# Altium footprint library Cty1.PcbLib: 1378 footprints (part 85 of 87)
Each footprint in its own frame and in the unit in brackets; x right, y up, seen from the top. Pads: shape width x height; smd on the part's side, far side on the other; paste and mask are expansions set on the pad; w line width, h text height; cw(c..) or ccw(c..) is an arc to the next point about the centre after c.
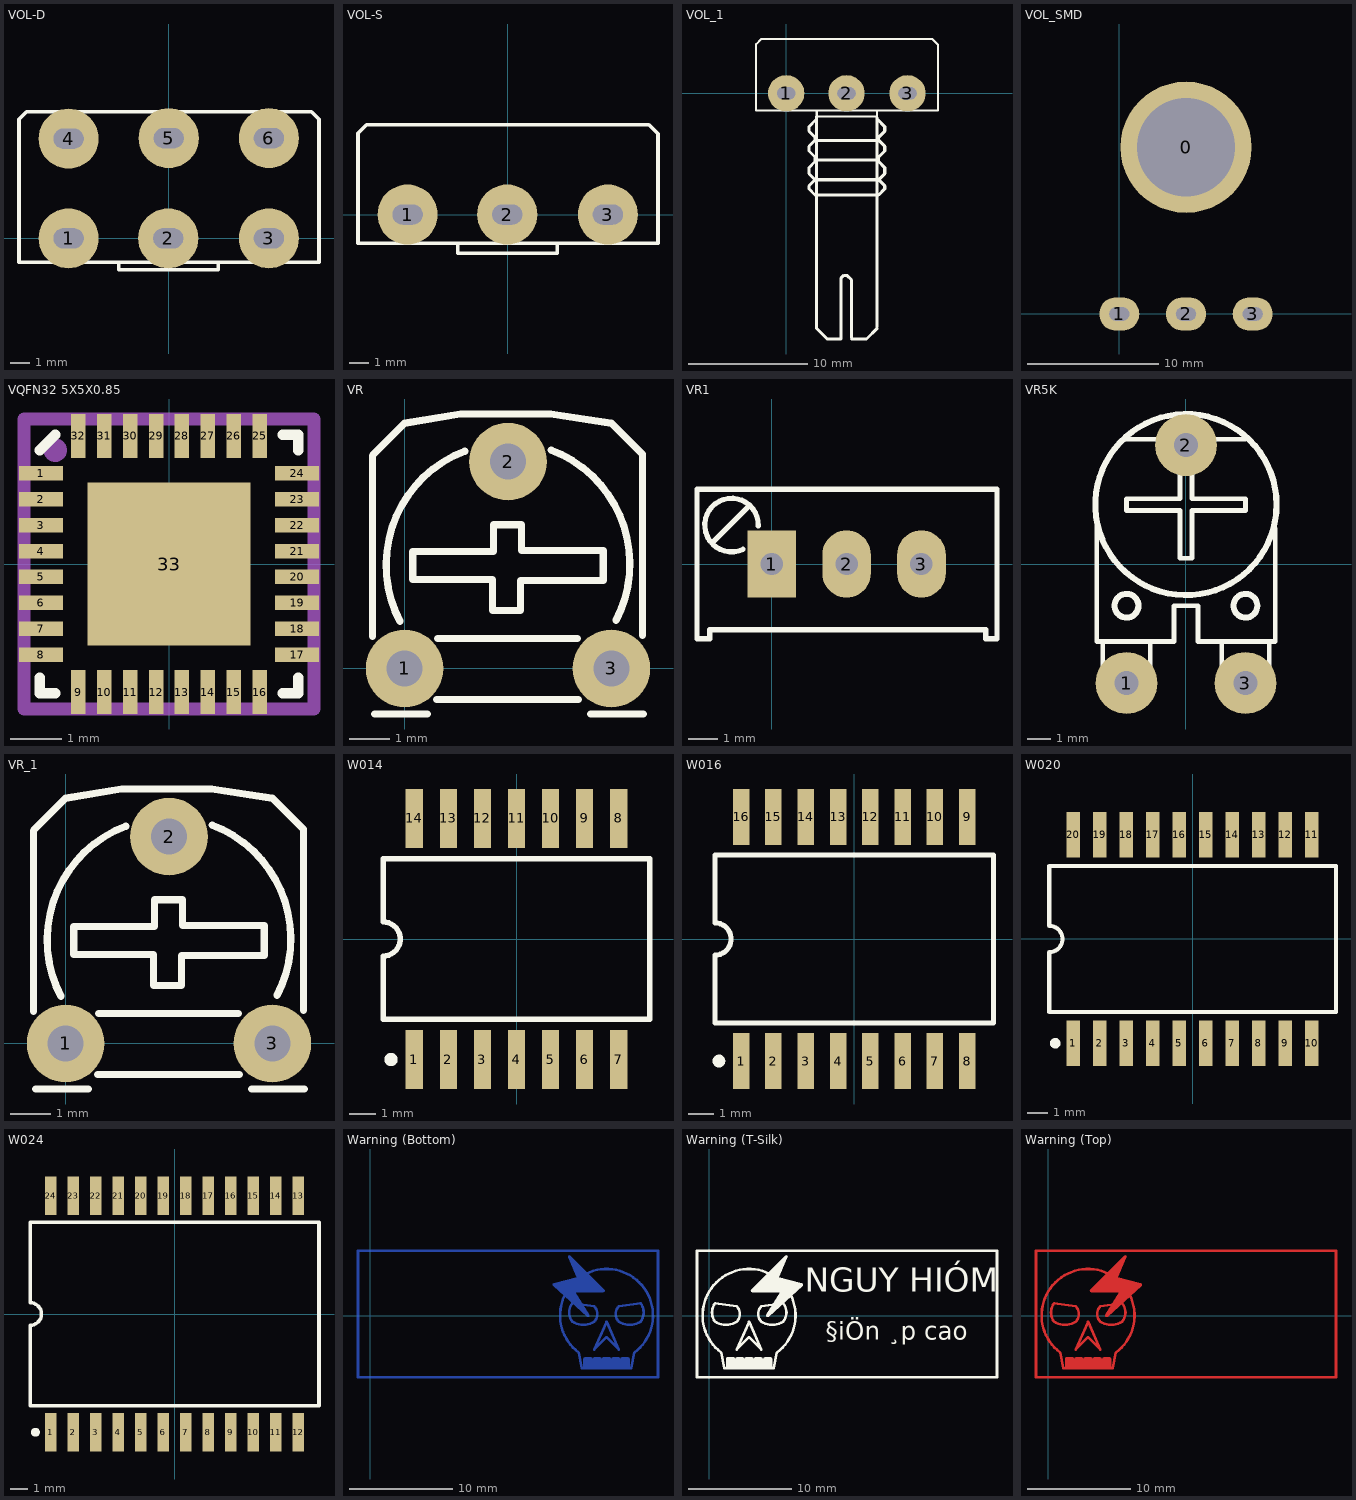
[diagram p84: the footprints below, top view; thin cyan lines are the x and y axes]

## VOL-D [mil] "Volume control Dual"
height 400
pads (6):
  round 120 hole 40 slot 60 at 0 deg: 1(-200,0) 2(-1,0) 3(200,0) 4(-200,199) 5(0,200) 6(200,200)
Top Overlay:
  lines w7: -100,-48 -100,-63 99,-63 99,-48 ; -299,-48 300,-48 300,238 285,253 -284,253 -299,238 -299,-48
3D body "SW3dPS-ALPHA-potentiometer stereo PCB mount.STEP": height 834.65, standoff -129.92, extent -338.65,-1309.27 330.65,299

## VOL-S [mil] "Volume control single"
height 400
pads (3):
  round 120 hole 40 slot 60 at 0 deg: 1(-200,0) 2(-1,0) 3(200,0)
Top Overlay:
  lines w7: -100,-57 -100,-77 99,-77 99,-57 ; -299,-57 -299,162 -282,179 282,179 300,161 300,-57 -299,-57

## VOL_1 [mil]
pads (3):
  round 120 hole 40 slot 60 at 0 deg: 1(0,0) 2(199,0) 3(400,0)
Top Overlay:
  lines w7: 100,-57 100,-77 299,-77 299,-57 ; 101,-77 101,-57 ; -99,-57 500,-57 500,161 482,179 -82,179 -99,162 -99,-57
  lines w10: 95,-335 75,-315 75,-305 95,-285 75,-265 75,-245 95,-225 95,-210 75,-190 75,-175 95,-155 95,-145 75,-125 75,-110 100,-85 ; 95,-220 300,-220 ; 100,-770 100,-77 ; 100,-760 100,-775 135,-810 180,-810 180,-610 190,-600 200,-600 215,-615 215,-805 ; 100,-335 305,-335 325,-315 325,-305 305,-285 ; 100,-285 305,-285 ; 105,-155 300,-155 ; 215,-810 265,-810 300,-775 ; 300,-770 300,-80 ; 300,-85 325,-110 325,-125 305,-145 305,-155 325,-175 325,-190 305,-210 305,-225 325,-245 325,-265 305,-285
3D body "SW3dPS-Pot.STEP": height 839.35, standoff -130, extent -110,-818.11 510,188.11

## VOL_SMD [mil]
pads (4):
  round 393.7 hole 295.28: 0(200,500)
  oval 120x100 hole 40 slot 60 at 0 deg: 1(0,0) 2(200,0) 3(400,0)
Bottom Overlay:
  circle w12: c400,150 r50
  circle w12: c200,150 r50
  circle w12: c0,150 r50
  circle w12: c200,500 r215.01
  lines w12: -57.25,301.71 cw(c200,500) 455.57,299.55 ; -55,299 127,299 ; -49,700 119,700 ; 281,298 455,298 ; 286,698 454,698 ; 455,295 500,250 500,-75 -100,-75 -100,255 ; -100,255 -55,300 -100,255
3D body "SW3dPS-omeg pot.STEP": height 866.14, standoff -407.48, extent -203.15,-247.08 600,947.08

## VQFN32 5X5X0.85 [mm] "Creator MM"
pads (33):
  rect 0.85x0.28 smd mask+0.025: 1(-2.475,1.75) 2(-2.475,1.25) 3(-2.475,0.75) 4(-2.475,0.25) 5(-2.475,-0.25) 6(-2.475,-0.75) 7(-2.475,-1.25) 8(-2.475,-1.75) 17(2.475,-1.75) 18(2.475,-1.25) 19(2.475,-0.75) 20(2.475,-0.25) 21(2.475,0.25) 22(2.475,0.75) 23(2.475,1.25) 24(2.475,1.75)
  rect 0.28x0.85 smd mask+0.025: 9(-1.75,-2.475) 10(-1.25,-2.475) 11(-0.75,-2.475) 12(-0.25,-2.475) 13(0.25,-2.475) 14(0.75,-2.475) 15(1.25,-2.475) 16(1.75,-2.475) 25(1.75,2.475) 26(1.25,2.475) 27(0.75,2.475) 28(0.25,2.475) 29(-0.25,2.475) 30(-0.75,2.475) 31(-1.25,2.475) 32(-1.75,2.475)
  rect 3.15x3.15 smd paste-10 mask+0.025: 33(0,0)
Top Overlay:
  lines w0.2: -2.5,-2.2 -2.5,-2.5 -2.2,-2.5 ; -2.5,2.2 -2.2,2.5 ; 2.2,-2.5 2.5,-2.5 2.5,-2.2 ; 2.2,2.5 2.5,2.5 2.5,2.2
Top Paste:
  rectangle: -1.5,0.1 -0.1,1.5
  region: 0.1,1.5 0.1,0.1 1.5,0.1 1.5,1.5
  region: -0.1,-1.5 -0.1,-0.1 -1.5,-0.1 -1.5,-1.5
  region: 1.5,-0.1 0.1,-0.1 0.1,-1.5 1.5,-1.5
Mechanical 16:
  circle w0.254: c-2.2,2.2 r0.1
  lines w0.254: -2.8,-2.8 -2.8,2.8 2.8,2.8 2.8,-2.8 -2.8,-2.8
Mechanical 29:
  text ".Designator" at -0.6,1 h1.2
3D body: height 0.9, standoff 0, extent -2.5,-2.5 2.5,2.5

## VR [mil] "Resistor Variable"
height 200
pads (3):
  round 75 hole 35: 1(0,0) 2(100,200) 3(200,0)
Top Overlay:
  lines w7: -31,31 -31,206 0,237 54,246 141.5,246 200,237 230,207 230,32 ; -29,-44 22,-44 ; -4.35,45.34 cw(c100,100) 58.1,210.1 ; 8,113 8,86 85,86 85,56 112,56 112,85 192,85 192,114 113,114 113,139 86,139 86,113 9,113 ; 31,-30 168,-30 ; 32,29 167,29 ; 141.9,211.1 cw(c100,101) 204.35,46.34 ; 180,-44 231,-44
3D body "SW3dPS-Trimpot Horizontal.STEP": height 165.35, standoff -220.47, extent -86.85,-30 306.85,371.57

## VR1 [mil] "Variable Resistor"
height 400
pads (3):
  rect 65x90 hole 30: 1(0,0)
  oval 65x90 hole 30: 2(100,0) 3(200,0)
Top Overlay:
  lines w7: -80,28 -30,78 ; -38.6,19.63 cw(c-53.79,52.05) -18.01,50.77 ; -100,-100 -83,-100 -83,-88 286,-88 286,-100 301,-100 301,100 -100,100 -100,-100
3D body "SW3dPS-Bourns_3299W.STEP": height 455, standoff -45, extent -87.5,-130 287.5,110

## VR5K [mm]
pads (3):
  round 2.6 hole 1 paste+5: 1(-2.5,-5) 2(0,5) 3(2.5,-5)
Top Overlay:
  circle w0.254: c0,2.5 r3.808
  circle w0.254: c2.5,-1.75 r0.5
  circle w0.254: c-2.5,-1.75 r0.5
  lines w0.2: -3.75,1.75 -3.75,-3.25 -0.5,-3.25 -0.5,-1.75 0.5,-1.75 0.5,-3.25 3.75,-3.25 3.75,1.5 ; -3.5,-4.25 -3.5,-3.25 ; -2.5,5.25 2.5,5.25 ; -1.5,-4.75 -1.5,-3.25 ; 1.5,-4.75 1.5,-3.25 ; 3.5,-4.75 3.5,-3.25 ; -2.5,2.25 -0.25,2.25 -0.25,0.25 0.25,0.25 0.25,2.25 2.5,2.25 2.5,2.75 0.25,2.75 0.25,4.75 -0.25,4.75 -0.25,2.75 -2.5,2.75 -2.5,2.25
3D body "VR-1-3D.STEP": height 7.62, standoff -2.54, extent -4.318,-5.045 4.318,5.75

## VR_1 [mil] "Resistor Variable"
height 200
pads (3):
  round 75 hole 35: 1(0,0) 2(100,200) 3(200,0)
Top Overlay:
  lines w7: -31,31 -31,206 0,237 54,246 141.5,246 200,237 230,207 230,32 ; -29,-44 22,-44 ; -4.35,45.34 cw(c100,100) 58.1,210.1 ; 8,113 8,86 85,86 85,56 112,56 112,85 192,85 192,114 113,114 113,139 86,139 86,113 9,113 ; 31,-30 168,-30 ; 32,29 167,29 ; 141.9,211.1 cw(c100,101) 204.35,46.34 ; 180,-44 231,-44
3D body "User Library-Trimmer varistor-1.STEP": height 300, standoff -119.49, extent -34.05,-86.98 234.06,237.89

## W014 [mm] "DFP; 14 Leads; Body 9.9 x 6.6 mm (LxW max); Pitch 1.27 mm"
height 2.03
pads (14):
  rect 0.65x2.2 smd: 1(-3.81,-4.5) 2(-2.54,-4.5) 3(-1.27,-4.5) 4(0,-4.5) 5(1.27,-4.5) 6(2.54,-4.5) 7(3.81,-4.5) 8(3.81,4.5) 9(2.54,4.5) 10(1.27,4.5) 11(0,4.5) 12(-1.27,4.5) 13(-2.54,4.5) 14(-3.81,4.5)
Top Overlay:
  circle w0.25: c-4.685,-4.5 r0.125
  lines w0.2: -4.975,-3 4.975,-3 4.975,3 -4.975,3 -4.975,0.635 cw(c-4.975,0) -4.975,-0.635 -4.975,-3

## W016 [mm] "DFP; 16 Leads; Body 10.9 x 7.2 mm (LxW max); Pitch 1.27 mm"
height 2.03
pads (16):
  rect 0.65x2.2 smd: 1(-4.445,-4.8) 2(-3.175,-4.8) 3(-1.905,-4.8) 4(-0.635,-4.8) 5(0.635,-4.8) 6(1.905,-4.8) 7(3.175,-4.8) 8(4.445,-4.8) 9(4.445,4.8) 10(3.175,4.8) 11(1.905,4.8) 12(0.635,4.8) 13(-0.635,4.8) 14(-1.905,4.8) 15(-3.175,4.8) 16(-4.445,4.8)
Top Overlay:
  circle w0.25: c-5.32,-4.8 r0.125
  lines w0.2: -5.475,-3.3 5.475,-3.3 5.475,3.3 -5.475,3.3 -5.475,0.635 cw(c-5.475,0) -5.475,-0.635 -5.475,-3.3

## W020 [mm] "DFP; 20 Leads; Body 13.7 x 7.6 mm (LxW max); Pitch 1.27 mm"
height 2.54
pads (20):
  rect 0.65x2.2 smd: 1(-5.715,-5) 2(-4.445,-5) 3(-3.175,-5) 4(-1.905,-5) 5(-0.635,-5) 6(0.635,-5) 7(1.905,-5) 8(3.175,-5) 9(4.445,-5) 10(5.715,-5) 11(5.715,5) 12(4.445,5) 13(3.175,5) 14(1.905,5) 15(0.635,5) 16(-0.635,5) 17(-1.905,5) 18(-3.175,5) 19(-4.445,5) 20(-5.715,5)
Top Overlay:
  circle w0.25: c-6.59,-5 r0.125
  lines w0.2: -6.875,-3.5 6.875,-3.5 6.875,3.5 -6.875,3.5 -6.875,0.635 cw(c-6.875,0) -6.875,-0.635 -6.875,-3.5

## W024 [mm] "DFP; 24 Leads; Body 16.3 x 9.5 mm (LxW max); Pitch 1.27 mm"
height 2.29
pads (24):
  rect 0.65x2.2 smd: 1(-6.985,-6.675) 2(-5.715,-6.675) 3(-4.445,-6.675) 4(-3.175,-6.675) 5(-1.905,-6.675) 6(-0.635,-6.675) 7(0.635,-6.675) 8(1.905,-6.675) 9(3.175,-6.675) 10(4.445,-6.675) 11(5.715,-6.675) 12(6.985,-6.675) 13(6.985,6.675) 14(5.715,6.675) 15(4.445,6.675) 16(3.175,6.675) 17(1.905,6.675) 18(0.635,6.675) 19(-0.635,6.675) 20(-1.905,6.675) 21(-3.175,6.675) 22(-4.445,6.675) 23(-5.715,6.675) 24(-6.985,6.675)
Top Overlay:
  circle w0.25: c-7.86,-6.675 r0.125
  lines w0.2: -8.15,-5.175 -8.15,-0.635 ccw(c-8.15,0) -8.15,0.635 -8.15,5.175 8.15,5.175 8.15,-5.175 -8.15,-5.175

## Warning (Bottom) [mm]
Bottom Layer:
  region: 19.314,5.829 19.285,5.829 19.267,5.81 19.242,5.8 19.232,5.774 19.212,5.754 19.212,5.727 19.202,5.703 19.213,5.677 19.213,5.649 20.05,3.696 17.806,3.135 17.773,3.111 17.737,3.094 17.732,3.081 17.721,3.073 17.715,3.033 17.702,2.995 17.708,2.983 17.705,2.969 17.729,2.936 17.746,2.9 21.048,-0.102 21.081,-0.114 21.11,-0.134 21.129,-0.131 21.147,-0.137 21.179,-0.122 21.213,-0.117 21.225,-0.101 21.242,-0.092 21.254,-0.059 21.274,-0.031 21.271,-0.012 21.278,0.007 21.263,0.038 21.257,0.073 19.888,2.264 22.641,2.264 22.738,2.304 22.779,2.401 22.738,2.498 19.437,5.8 19.411,5.811 19.391,5.83 19.364,5.83 19.34,5.84
  region: 24.345,-4.105 24.305,-4.202 24.305,-5.102 24.345,-5.2 24.442,-5.24 25.042,-5.24 25.139,-5.2 25.18,-5.102 25.18,-4.202 25.139,-4.105 25.042,-4.065 24.442,-4.065
  region: 21.644,-4.105 21.603,-4.202 21.603,-5.102 21.644,-5.2 21.741,-5.24 22.341,-5.24 22.438,-5.2 22.478,-5.102 22.478,-4.202 22.438,-4.105 22.341,-4.065 21.741,-4.065
  region: 20.743,-4.105 20.703,-4.202 20.703,-5.102 20.743,-5.2 20.84,-5.24 21.441,-5.24 21.538,-5.2 21.578,-5.102 21.578,-4.202 21.538,-4.105 21.441,-4.065 20.84,-4.065
  region: 23.444,-4.105 23.404,-4.202 23.404,-5.102 23.444,-5.2 23.542,-5.24 24.142,-5.24 24.239,-5.2 24.279,-5.102 24.279,-4.202 24.239,-4.105 24.142,-4.065 23.542,-4.065
  region: 22.544,-4.105 22.504,-4.202 22.504,-5.102 22.544,-5.2 22.641,-5.24 23.241,-5.24 23.338,-5.2 23.378,-5.102 23.378,-4.202 23.338,-4.105 23.241,-4.065 22.641,-4.065
  lines w0.254: -1.201,-6.003 27.94,-6.003 27.94,6.303 -1.201,6.303 -1.201,-6.003 ; 17.839,3.002 20.24,3.602 19.34,5.703 22.641,2.401 19.64,2.401 21.14,0 17.839,3.002 ; 19.64,-0.6 ccw(c20.69,1.05) 21.741,-0.6 ccw(c20.991,0.15) 21.741,0.9 19.64,1.201 ccw(c20.69,0.3) 19.64,-0.6 ; 20.24,-3.602 cw(c22.941,0.014) 25.643,-3.602 25.342,-5.102 20.54,-5.102 20.24,-3.602 ; 21.741,-3.302 22.941,-0.6 24.142,-3.302 22.941,-2.101 21.741,-3.302 ; 24.142,-0.6 cw(c24.892,0.15) 24.142,0.9 26.243,1.201 cw(c25.042,0.3) 26.243,-0.6 cw(c25.193,1.05) 24.142,-0.6
  text "§iÖn ¸p cao" at 14.732,-3.048 h3
  text "NGUY HIÓM" at 17.526,1.143 h4

## Warning (T-Silk) [mm]
Top Overlay:
  region: 7.483,5.829 7.512,5.829 7.53,5.81 7.555,5.8 7.565,5.774 7.585,5.754 7.585,5.727 7.595,5.703 7.584,5.677 7.584,5.649 6.747,3.696 8.991,3.135 9.024,3.111 9.06,3.094 9.065,3.081 9.076,3.073 9.082,3.033 9.095,2.995 9.089,2.983 9.092,2.969 9.068,2.936 9.051,2.9 5.749,-0.102 5.716,-0.114 5.687,-0.134 5.668,-0.131 5.65,-0.137 5.618,-0.122 5.584,-0.117 5.572,-0.101 5.555,-0.092 5.543,-0.059 5.523,-0.031 5.526,-0.012 5.519,0.007 5.534,0.038 5.54,0.073 6.909,2.264 4.156,2.264 4.059,2.304 4.018,2.401 4.059,2.498 7.36,5.8 7.386,5.811 7.406,5.83 7.433,5.83 7.457,5.84
  region: 2.452,-4.105 2.492,-4.202 2.492,-5.102 2.452,-5.2 2.355,-5.24 1.755,-5.24 1.658,-5.2 1.617,-5.102 1.617,-4.202 1.658,-4.105 1.755,-4.065 2.355,-4.065
  region: 5.153,-4.105 5.194,-4.202 5.194,-5.102 5.153,-5.2 5.056,-5.24 4.456,-5.24 4.359,-5.2 4.319,-5.102 4.319,-4.202 4.359,-4.105 4.456,-4.065 5.056,-4.065
  region: 6.054,-4.105 6.094,-4.202 6.094,-5.102 6.054,-5.2 5.957,-5.24 5.356,-5.24 5.259,-5.2 5.219,-5.102 5.219,-4.202 5.259,-4.105 5.356,-4.065 5.957,-4.065
  region: 3.353,-4.105 3.393,-4.202 3.393,-5.102 3.353,-5.2 3.255,-5.24 2.655,-5.24 2.558,-5.2 2.518,-5.102 2.518,-4.202 2.558,-4.105 2.655,-4.065 3.255,-4.065
  region: 4.253,-4.105 4.293,-4.202 4.293,-5.102 4.253,-5.2 4.156,-5.24 3.556,-5.24 3.459,-5.2 3.419,-5.102 3.419,-4.202 3.459,-4.105 3.556,-4.065 4.156,-4.065
  lines w0.254: -1.201,-6.003 27.94,-6.003 27.94,6.303 -1.201,6.303 -1.201,-6.003 ; 0.554,-0.6 cw(c1.755,0.3) 0.554,1.201 2.655,0.9 cw(c1.905,0.15) 2.655,-0.6 cw(c1.604,1.05) 0.554,-0.6 ; 1.154,-3.602 cw(c3.856,0.014) 6.557,-3.602 6.257,-5.102 1.455,-5.102 1.154,-3.602 ; 2.655,-3.302 3.856,-2.101 5.056,-3.302 3.856,-0.6 2.655,-3.302 ; 4.156,2.401 7.157,2.401 5.657,0 8.958,3.002 6.557,3.602 7.457,5.703 4.156,2.401 ; 5.056,-0.6 ccw(c6.107,1.05) 7.157,-0.6 ccw(c6.107,0.3) 7.157,1.201 5.056,0.9 ccw(c5.806,0.15) 5.056,-0.6
  text "§iÖn ¸p cao" at 11.303,-2.921 h3
  text "NGUY HIÓM" at 9.271,1.524 h4

## Warning (Top) [mm]
Top Layer:
  region: 7.483,5.829 7.512,5.829 7.53,5.81 7.555,5.8 7.565,5.774 7.585,5.754 7.585,5.727 7.595,5.703 7.584,5.677 7.584,5.649 6.747,3.696 8.991,3.135 9.024,3.111 9.06,3.094 9.065,3.081 9.076,3.073 9.082,3.033 9.095,2.995 9.089,2.983 9.092,2.969 9.068,2.936 9.051,2.9 5.749,-0.102 5.716,-0.114 5.687,-0.134 5.668,-0.131 5.65,-0.137 5.618,-0.122 5.584,-0.117 5.572,-0.101 5.555,-0.092 5.543,-0.059 5.523,-0.031 5.526,-0.012 5.519,0.007 5.534,0.038 5.54,0.073 6.909,2.264 4.156,2.264 4.059,2.304 4.018,2.401 4.059,2.498 7.36,5.8 7.386,5.811 7.406,5.83 7.433,5.83 7.457,5.84
  region: 2.452,-4.105 2.492,-4.202 2.492,-5.102 2.452,-5.2 2.355,-5.24 1.755,-5.24 1.658,-5.2 1.617,-5.102 1.617,-4.202 1.658,-4.105 1.755,-4.065 2.355,-4.065
  region: 5.153,-4.105 5.194,-4.202 5.194,-5.102 5.153,-5.2 5.056,-5.24 4.456,-5.24 4.359,-5.2 4.319,-5.102 4.319,-4.202 4.359,-4.105 4.456,-4.065 5.056,-4.065
  region: 6.054,-4.105 6.094,-4.202 6.094,-5.102 6.054,-5.2 5.957,-5.24 5.356,-5.24 5.259,-5.2 5.219,-5.102 5.219,-4.202 5.259,-4.105 5.356,-4.065 5.957,-4.065
  region: 3.353,-4.105 3.393,-4.202 3.393,-5.102 3.353,-5.2 3.255,-5.24 2.655,-5.24 2.558,-5.2 2.518,-5.102 2.518,-4.202 2.558,-4.105 2.655,-4.065 3.255,-4.065
  region: 4.253,-4.105 4.293,-4.202 4.293,-5.102 4.253,-5.2 4.156,-5.24 3.556,-5.24 3.459,-5.2 3.419,-5.102 3.419,-4.202 3.459,-4.105 3.556,-4.065 4.156,-4.065
  lines w0.254: -1.201,-6.003 27.94,-6.003 27.94,6.303 -1.201,6.303 -1.201,-6.003 ; 0.554,-0.6 cw(c1.755,0.3) 0.554,1.201 2.655,0.9 cw(c1.905,0.15) 2.655,-0.6 cw(c1.604,1.05) 0.554,-0.6 ; 1.154,-3.602 cw(c3.856,0.014) 6.557,-3.602 6.257,-5.102 1.455,-5.102 1.154,-3.602 ; 2.655,-3.302 3.856,-2.101 5.056,-3.302 3.856,-0.6 2.655,-3.302 ; 4.156,2.401 7.157,2.401 5.657,0 8.958,3.002 6.557,3.602 7.457,5.703 4.156,2.401 ; 5.056,-0.6 ccw(c6.107,1.05) 7.157,-0.6 ccw(c6.107,0.3) 7.157,1.201 5.056,0.9 ccw(c5.806,0.15) 5.056,-0.6
  text "§iÖn ¸p cao" at 11.303,-2.921 h3
  text "NGUY HIÓM" at 9.271,1.524 h4